# Altium footprint library SparkFun.PCBLIB: 674 footprints (part 18 of 44)
Each footprint in its own frame and in the unit in brackets; x right, y up, seen from the top. Pads: shape width x height; smd on the part's side, far side on the other; paste and mask are expansions set on the pad; w line width, h text height; cw(c..) or ccw(c..) is an arc to the next point about the centre after c.
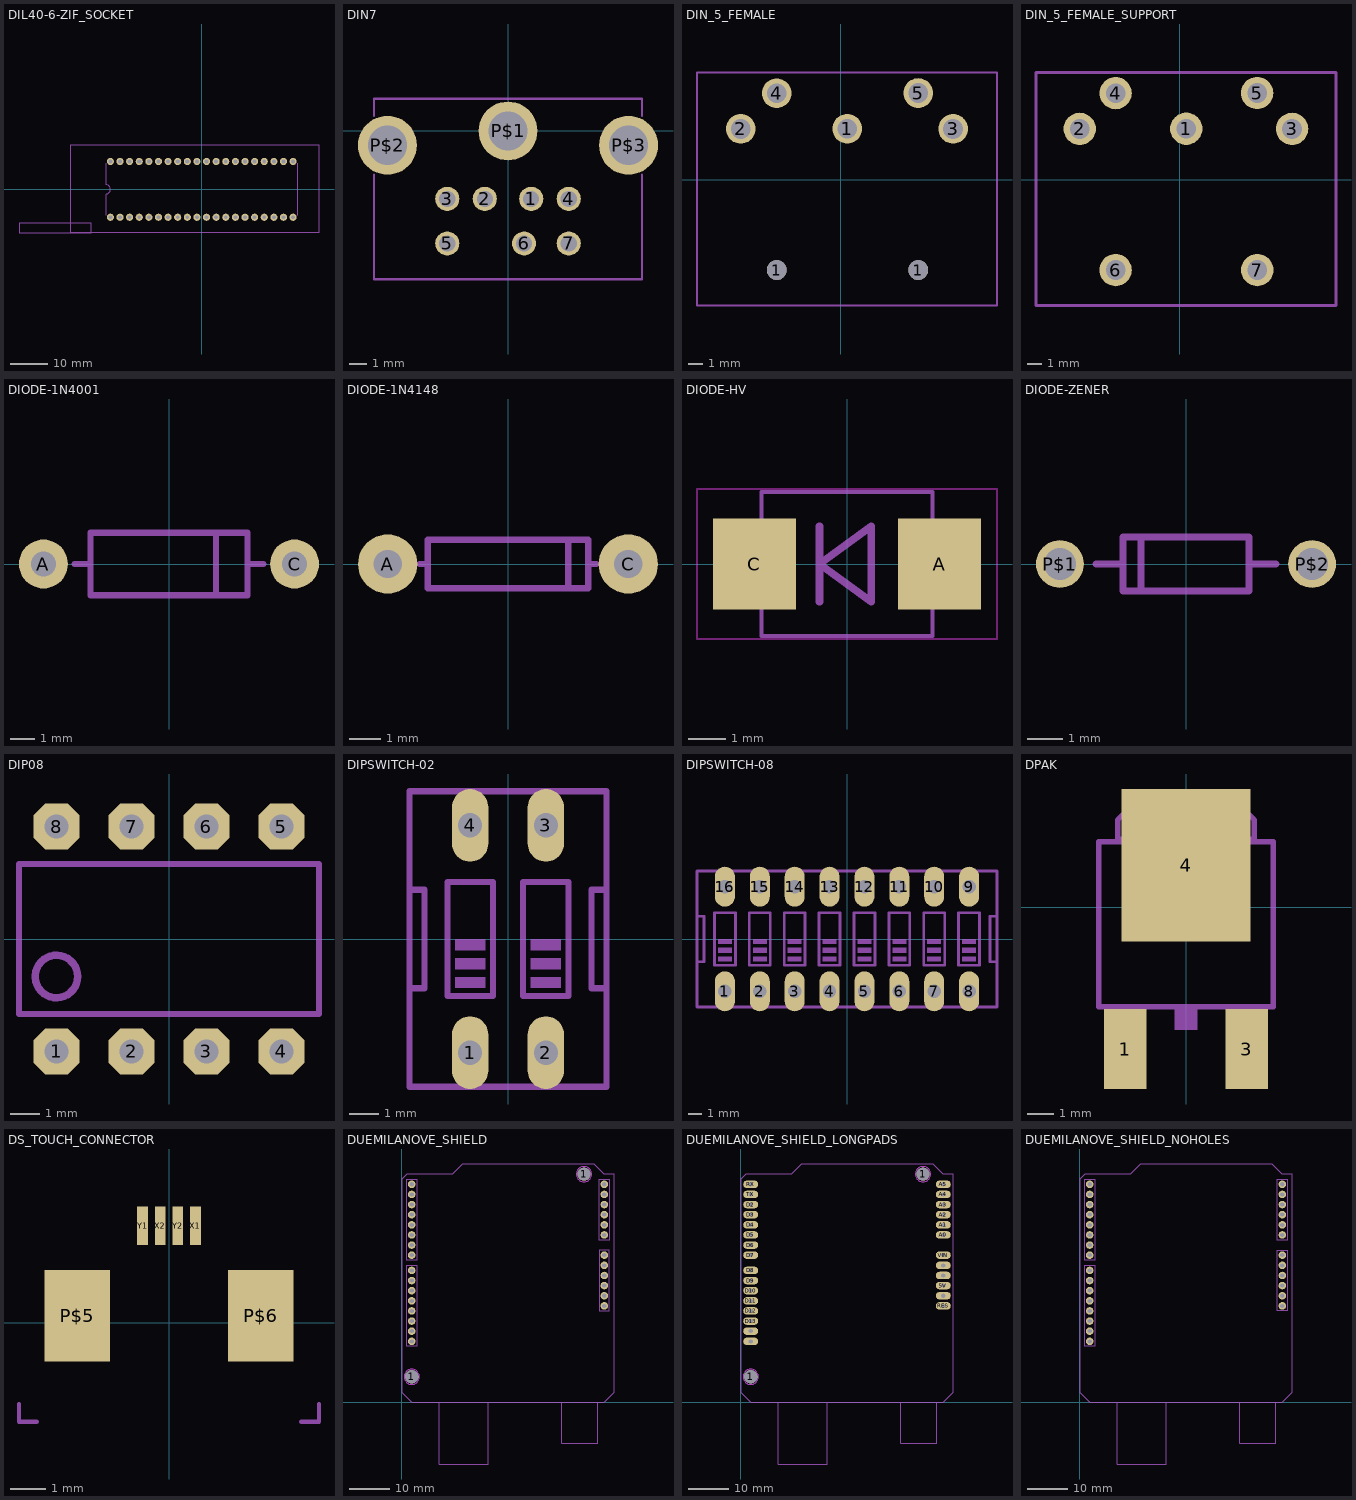
[diagram p17: the footprints below, top view; thin cyan lines are the x and y axes]

## DIL40-6-ZIF_SOCKET [mil]
pads (40):
  round 74 hole 40: 1(-950,-290) 2(-850,-290) 3(-750,-290) 4(-650,-290) 5(-550,-290) 6(-450,-290) 7(-350,-290) 8(-250,-290) 9(-150,-290) 10(-50,-290) 11(50,-290) 12(150,-290) 13(250,-290) 14(350,-290) 15(450,-290) 16(550,-290) 17(650,-290) 18(750,-290) 19(850,-290) 20(950,-290) 21(950,290) 22(850,290) 23(750,290) 24(650,290) 25(550,290) 26(450,290) 27(350,290) 28(250,290)
  round 74 hole 43.31: 29(150,290) 30(50,290) 31(-50,290) 32(-150,290) 33(-250,290) 34(-350,290) 35(-450,290) 36(-550,290) 37(-650,290) 38(-750,290) 39(-850,290) 40(-950,290)
Mechanical 2:
  lines w8: -1000,-270 -1000,-50 ccw(c-1000,0) -1000,50 -1000,270 ; 1000,-270 1000,270
Mechanical 18:
  lines w10: -1900,-450 -1900,-350 -1150,-350 -1150,-450 -1900,-450 ; -1368.58,-448.07 1219.21,-448.07 1219.21,457.44 -1368.58,457.44 -1368.58,-448.07

## DIN7 [mil]
pads (10):
  round 53.15 hole 35.43: 1(51.18,-149.61) 2(-51.18,-149.61) 3(-133.86,-149.61) 4(133.86,-149.61) 5(-133.86,-248.03) 6(35.43,-248.03) 7(133.86,-248.03)
  round 129.91 hole 86.61: P$1(0,0) P$2(-265.75,-31.5) P$3(265.75,-31.5)
Mechanical 2:
  lines w5: -295.28,-96.46 -295.28,-326.77 295.28,-326.77 295.28,-96.46 ; -295.28,33.46 -295.28,70.87 295.28,70.87 295.28,33.46

## DIN_5_FEMALE [mm]
pads (7):
  round 1.4 hole 1.4: 1(-4.52,-6.38) 1(5.47,-6.38)
  round 2.1 hole 1.4: 1(0.46,3.61) 2(-7.07,3.6) 3(7.94,3.6) 4(-4.53,6.12) 5(5.47,6.13)
Mechanical 2:
  lines w0.127: -10.16,-8.89 11.04,-8.89 11.04,7.59 -10.16,7.59 -10.16,-8.89
Mechanical 18:
  lines w0.09: 0.44,3.6 0.46,3.6

## DIN_5_FEMALE_SUPPORT [mil]
pads (7):
  round 90 hole 55.12: 1(18.11,142.13) 2(-278.35,141.73) 3(312.6,141.73) 4(-178.35,240.94) 5(215.35,241.34) 6(-178.35,-251.27) 7(215.65,-251.27)
Mechanical 2:
  lines w8: -400,-350 434.65,-350 434.65,298.82 -400,298.82 -400,-350
Mechanical 18:
  lines w3.54: 17.32,141.73 18.11,141.73

## DIODE-1N4001 [mil]
pads (2):
  round 78 hole 39.37: A(-200,0) C(200,0)
Mechanical 2:
  lines w10: -150,0 -125,0 ; 150,0 125,0 ; -125,0 -125,50 75,50 ; -125,0 -125,-50 75,-50 ; 75,-50 125,-50 125,0 ; 75,-50 75,50 ; 75,50 125,50 125,0

## DIODE-1N4148 [mil]
pads (2):
  round 74 hole 35.43: A(-150,0) C(150,0)
Mechanical 2:
  lines w8: -110,0 -100,0 ; 75,-25 75,25 ; 110,0 100,0 ; -100,0 -100,-30 100,-30 100,0 ; -100,0 -100,30 100,30 100,0

## DIODE-HV [mil]
pads (2):
  rect 86.61x94.49 smd: A(96.61,0) C(-96.61,0)
Keep-Out Layer:
  lines w2: -156.42,-78.07 156.42,-78.07 156.42,78.07 -156.42,78.07 -156.42,-78.07
Mechanical 2:
  lines w4: -89,-75 89,-75 ; -89,75 89,75
  lines w8: -28.74,-39.37 -28.74,39.37 ; -28.74,0 25.32,39.37 25.32,-39.37 -28.74,0
Mechanical 18:
  rectangle: -110,-43 -89,43
  rectangle: 89,-43 110,43
  lines w4: -89.02,-75 -89.02,75 ; 89.02,-75 89.02,75

## DIODE-ZENER [mil]
pads (2):
  round 53.15 hole 35.43: P$1(-140,0) P$2(140,0)
Mechanical 2:
  lines w8: -100,0 -70,0 ; -50,-25 -50,25 ; 100,0 70,0 ; -70,0 -70,-30 70,-30 70,0 ; -70,0 -70,30 70,30 70,0

## DIP08 [mil]
pads (8):
  oct 61x61 hole 32: 1(-150,-150) 2(-50,-150) 3(50,-150) 4(150,-150) 5(150,150) 6(50,150) 7(-50,150) 8(-150,150)
Mechanical 2:
  circle w10: c-150,-50 r28.28
  lines w8: -200,-40 -200,-60 ; -200,-60 -200,100 200,100 200,-100 -200,-100 -200,-60

## DIPSWITCH-02 [mil]
pads (4):
  oval 48x96 hole 32: 1(-50,-150) 2(50,-150) 3(50,150) 4(-50,150)
Mechanical 2:
  rectangle: 30,-15 70,0
  rectangle: 30,-40 70,-25
  rectangle: 30,-65 70,-50
  rectangle: -70,-15 -30,0
  rectangle: -70,-40 -30,-25
  rectangle: -70,-65 -30,-50
  lines w8: -130,-65 -110,-65 -110,65 -130,65 ; -130,-65 -130,-195 130,-195 130,-65 ; -130,-65 -130,65 ; -130,65 -130,195 130,195 130,65 ; 130,-65 110,-65 110,65 130,65 ; 130,-65 130,65 ; -80,-75 -80,75 -20,75 -20,-75 -80,-75 ; 20,-75 20,75 80,75 80,-75 20,-75

## DIPSWITCH-08 [mil]
pads (16):
  oval 57.28x114.57 hole 38.19: 1(-350,-150) 2(-250,-150) 3(-150,-150) 4(-50,-150) 5(50,-150) 6(150,-150) 7(250,-150) 8(350,-150) 9(350,150) 10(250,150) 11(150,150) 12(50,150) 13(-50,150) 14(-150,150) 15(-250,150) 16(-350,150)
Mechanical 2:
  rectangle: 330,-15 370,0
  rectangle: 330,-40 370,-25
  rectangle: 330,-65 370,-50
  rectangle: 230,-15 270,0
  rectangle: 230,-40 270,-25
  rectangle: 230,-65 270,-50
  rectangle: 130,-15 170,0
  rectangle: 130,-40 170,-25
  rectangle: 130,-65 170,-50
  rectangle: 30,-15 70,0
  rectangle: 30,-40 70,-25
  rectangle: 30,-65 70,-50
  rectangle: -70,-15 -30,0
  rectangle: -70,-40 -30,-25
  rectangle: -70,-65 -30,-50
  rectangle: -170,-15 -130,0
  rectangle: -170,-40 -130,-25
  rectangle: -170,-65 -130,-50
  rectangle: -270,-15 -230,0
  rectangle: -270,-40 -230,-25
  rectangle: -270,-65 -230,-50
  rectangle: -370,-15 -330,0
  rectangle: -370,-40 -330,-25
  rectangle: -370,-65 -330,-50
  lines w8: -430,-65 -410,-65 -410,65 -430,65 ; -430,-65 -430,-195 430,-195 430,-65 ; -430,-65 -430,65 ; -430,65 -430,195 430,195 430,65 ; 430,-65 410,-65 410,65 430,65 ; 430,-65 430,65 ; -380,-75 -380,75 -320,75 -320,-75 -380,-75 ; -280,-75 -280,75 -220,75 -220,-75 -280,-75 ; -180,-75 -180,75 -120,75 -120,-75 -180,-75 ; -80,-75 -80,75 -20,75 -20,-75 -80,-75 ; 20,-75 20,75 80,75 80,-75 20,-75 ; 120,-75 120,75 180,75 180,-75 120,-75 ; 220,-75 220,75 280,75 280,-75 220,-75 ; 320,-75 320,75 380,75 380,-75 320,-75

## DPAK [mm]
pads (3):
  rect 1.6x3 smd: 1(-2.28,-5.31) 3(2.28,-5.31)
  rect 4.826x5.715 smd: 4(0,1.588)
Mechanical 2:
  rectangle: -0.432,-4.593 0.432,-3.831
  lines w0.203: -3.277,2.465 -3.277,-3.729 3.277,-3.729 3.277,2.465
Mechanical 18:
  rectangle: -2.718,-6.726 -1.854,-3.831
  rectangle: 1.854,-6.726 2.718,-3.831
  region: 0,0 0.254,0 0.254,0.254 0,0.254
  lines w0.203: -3.277,2.465 3.277,2.465 ; -2.565,2.567 -2.565,3.278 -2.108,3.735 2.108,3.735 2.565,3.278 2.565,2.567 -2.565,2.567

## DS_TOUCH_CONNECTOR [mil]
pads (6):
  rect 72.83x102.36 smd: P$5(-102.36,7.87) P$6(102.36,7.87)
  rect 11.81x43.31 smd: X1(29.53,108.27) X2(-9.84,108.27) Y1(-29.53,108.27) Y2(9.84,108.27)
Mechanical 2:
  lines w5: -167.32,-90.55 -167.32,-110.24 -147.64,-110.24 ; 147.64,-110.24 167.32,-110.24 167.32,-90.55

## DUEMILANOVE_SHIELD [mil]
pads (30):
  round 130 hole 130: 1(100,250) 1(1800,2250)
  round 74 hole 40: 3.3V(2000,1050) 5V(2000,1150) A0(2000,1650) A1(2000,1750) A2(2000,1850) A3(2000,1950) A4(2000,2050) A5(2000,2150) AREF(100,600) D2(100,1950) D3(100,1850) D4(100,1750) D5(100,1650) D6(100,1550) D7(100,1450) D8(100,1300) D9(100,1200) D10(100,1100) D11(100,1000) D12(100,900) D13(100,800) GND@0(2000,1250) GND@1(2000,1350) GND@2(100,700) RES(2000,950) RX(100,2150) TX(100,2050) VIN(2000,1450)
Mechanical 10 keep-out:
  circle w5: c100,250 r75
  circle w5: c1800,2250 r75
Mechanical 11 keep-out:
  circle w5: c100,250 r75
  circle w5: c1800,2250 r75
Mechanical 18:
  lines w5: 50,550 150,550 150,1350 50,1350 50,550 ; 50,1400 150,1400 150,2200 50,2200 50,1400 ; 1950,900 2050,900 2050,1500 1950,1500 1950,900 ; 1950,1600 2050,1600 2050,2200 1950,2200 1950,1600
  lines w10: 1582.68,-3.94 1582.68,-405.51 1937.01,-405.51 1937.01,-3.94 ; 374.02,0 100,0 0,100 0,2200 50,2250 500,2250 600,2350 1900,2350 2000,2250 2100,2250 2100,100 2000,0 854.33,0 ; 374.02,0 854.33,0 ; 374.02,0 374.02,-610.24 854.33,-610.24 854.33,0

## DUEMILANOVE_SHIELD_LONGPADS [mil]
pads (30):
  round 130 hole 130: 1(100,250) 1(1800,2250)
  oval 148x74 hole 40: 3.3V(2000,1050) 5V(2000,1150) A0(2000,1650) A1(2000,1750) A2(2000,1850) A3(2000,1950) A4(2000,2050) A5(2000,2150) AREF(100,600) D2(100,1950) D3(100,1850) D4(100,1750) D5(100,1650) D6(100,1550) D7(100,1450) D8(100,1300) D9(100,1200) D10(100,1100) D11(100,1000) D12(100,900) D13(100,800) GND@0(2000,1250) GND@1(2000,1350) GND@2(100,700) RES(2000,950) RX(100,2150) TX(100,2050) VIN(2000,1450)
Mechanical 10 keep-out:
  circle w5: c100,250 r75
  circle w5: c1800,2250 r75
Mechanical 11 keep-out:
  circle w5: c100,250 r75
  circle w5: c1800,2250 r75
Mechanical 18:
  lines w10: 1582.68,-3.94 1582.68,-405.51 1937.01,-405.51 1937.01,-3.94 ; 374.02,0 100,0 0,100 0,2200 50,2250 500,2250 600,2350 1900,2350 2000,2250 2100,2250 2100,100 2000,0 854.33,0 ; 374.02,0 854.33,0 ; 374.02,0 374.02,-610.24 854.33,-610.24 854.33,0

## DUEMILANOVE_SHIELD_NOHOLES [mil]
pads (28):
  round 74 hole 40: 3.3V(2000,1050) 5V(2000,1150) A0(2000,1650) A1(2000,1750) A2(2000,1850) A3(2000,1950) A4(2000,2050) A5(2000,2150) AREF(100,600) D2(100,1950) D3(100,1850) D4(100,1750) D5(100,1650) D6(100,1550) D7(100,1450) D8(100,1300) D9(100,1200) D10(100,1100) D11(100,1000) D12(100,900) D13(100,800) GND@0(2000,1250) GND@1(2000,1350) GND@2(100,700) RES(2000,950) RX(100,2150) TX(100,2050) VIN(2000,1450)
Mechanical 18:
  lines w5: 50,550 150,550 150,1350 50,1350 50,550 ; 50,1400 150,1400 150,2200 50,2200 50,1400 ; 1950,900 2050,900 2050,1500 1950,1500 1950,900 ; 1950,1600 2050,1600 2050,2200 1950,2200 1950,1600
  lines w10: 1582.68,-3.94 1582.68,-405.51 1937.01,-405.51 1937.01,-3.94 ; 374.02,0 100,0 0,100 0,2200 50,2250 500,2250 600,2350 1900,2350 2000,2250 2100,2250 2100,100 2000,0 854.33,0 ; 374.02,0 854.33,0 ; 374.02,0 374.02,-610.24 854.33,-610.24 854.33,0